# Altium footprint library Cty1.PcbLib: 1378 footprints (part 53 of 87)
Each footprint in its own frame and in the unit in brackets; x right, y up, seen from the top. Pads: shape width x height; smd on the part's side, far side on the other; paste and mask are expansions set on the pad; w line width, h text height; cw(c..) or ccw(c..) is an arc to the next point about the centre after c.
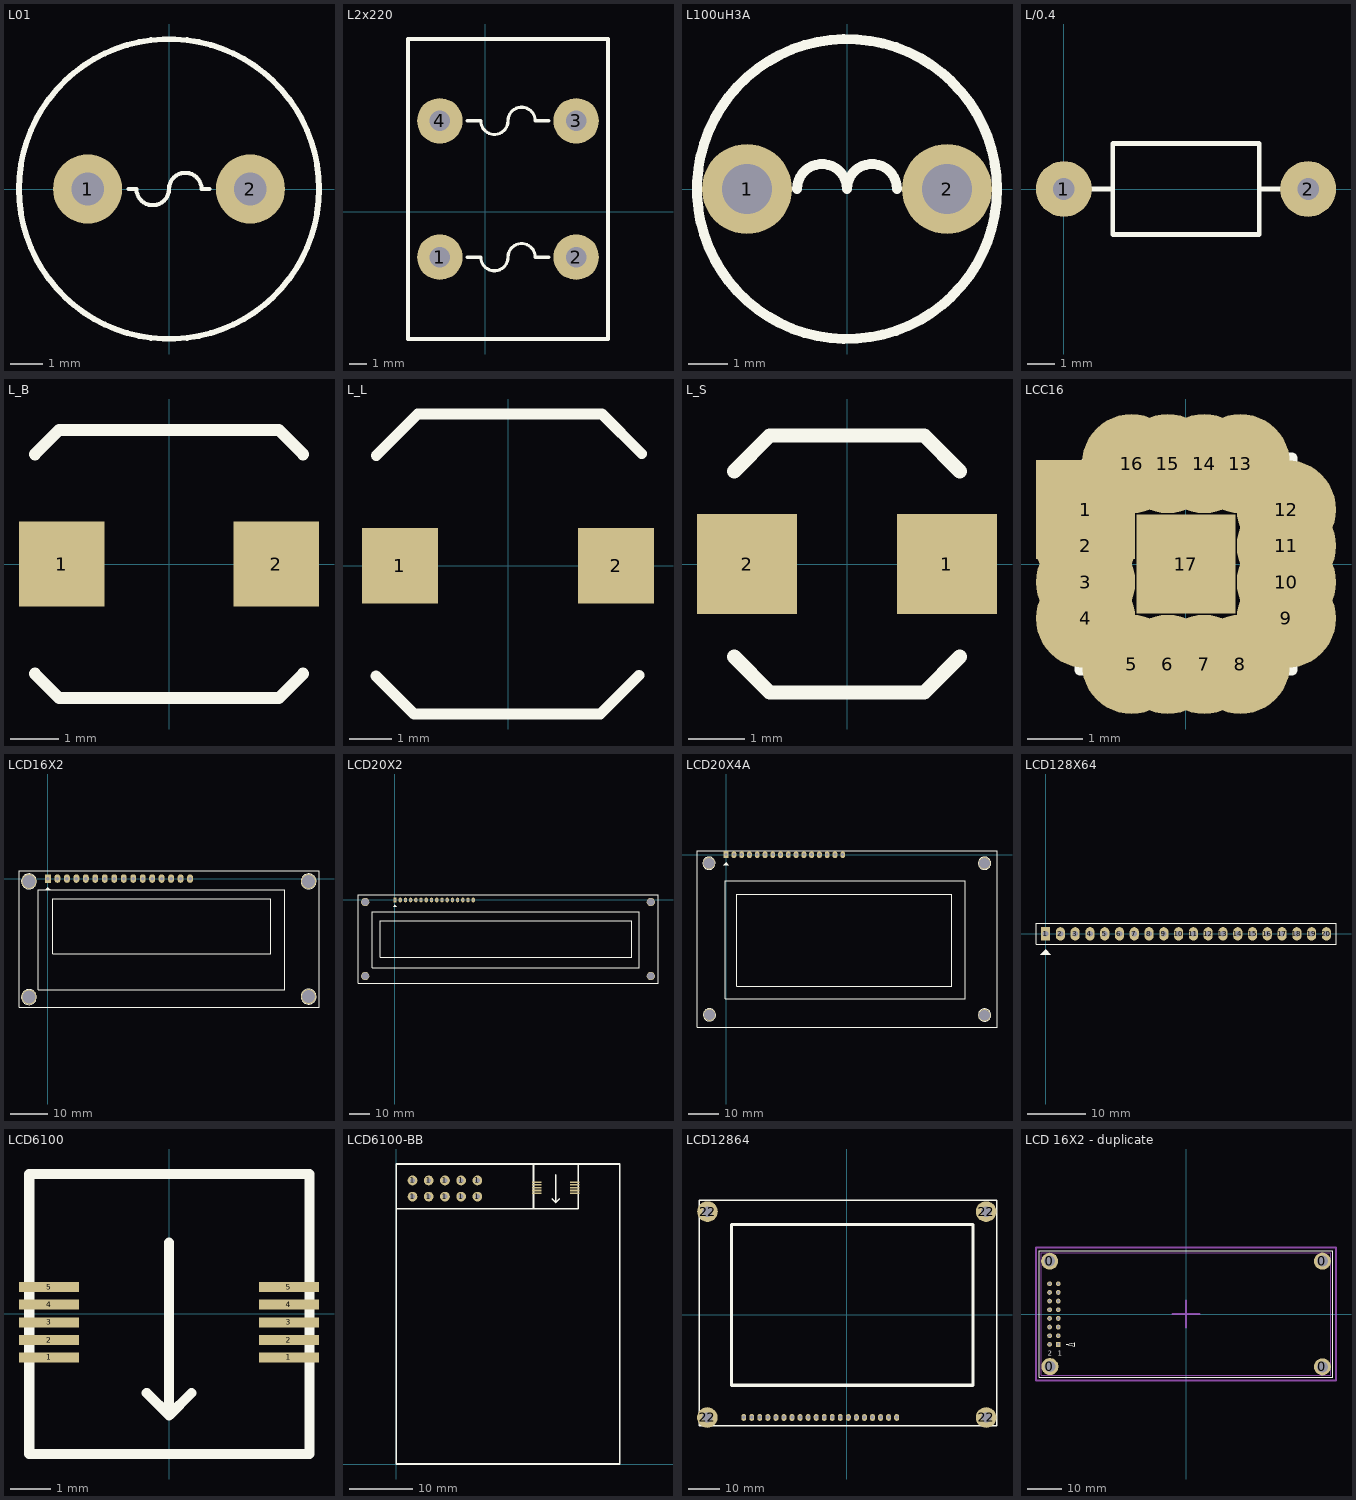
[diagram p52: the footprints below, top view; thin cyan lines are the x and y axes]

## L01 [mil] "Inductor"
pads (2):
  round 85 hole 40: 1(-100,0) 2(100,0)
Top Overlay:
  circle w7: c0,0 r184.39
  lines w5: -50,0 -40,0 ccw(c-20,0) 0,0 cw(c20,0) 40,0 50,0

## L2x220 [mil] "Loc 220"
pads (4):
  round 100 hole 45: 1(-100,-100) 2(200,-100) 3(200,200) 4(-100,200)
Top Overlay:
  lines w7: -10,-100 ccw(c20,-100) 50,-100 cw(c80,-100) 110,-100 ; -10,200 ccw(c20,200) 50,200 cw(c80,200) 110,200
  lines w8: -40,-100 -10,-100 ; -40,200 -10,200 ; 110,-100 140,-100 ; 110,200 140,200 ; -170,-280 270,-280 270,380 -170,380 -170,-280

## L100uH3A [mil] "100uH3A"
pads (2):
  round 90 hole 50: 1(-100,0) 2(100,0)
Top Overlay:
  circle w10: c0,0 r150
  lines w10: -50,0 cw(c-25,0) 0,0 cw(c25,0) 50,0

## L/0.4 [mil] "Inductor , 2 Pin, L 350mil, W 150 mil"
height 150
pads (2):
  round 80 hole 31: 1(0,0) 2(350,0)
Top Overlay:
  lines w7: 70,0 40,0 70,0 ; 70,0 70,-65 280,-65 280,0 ; 70,0 70,65 280,65 280,0 ; 280,0 310,0 280,0

## L_B [mil]
pads (2):
  rect 70x70 smd: 1(-88,0) 2(88,0)
Top Overlay:
  lines w10: -110,-90 -90,-110 90,-110 110,-90 ; -110,90 -90,110 90,110 110,90

## L_L [mil]
pads (2):
  rect 70x70 smd: 1(-100,0) 2(100,0)
Top Overlay:
  lines w10: -122.12,-102.12 -87,-137.25 85.5,-137.25 121.38,-101.38 ; -122,102 -83.5,140.5 87,140.5 123.75,103.75

## L_S [mil]
pads (2):
  rect 70x70 smd: 1(70,0) 2(-70,0)
Top Overlay:
  lines w10: -79,-65 -54,-90 54,-90 79,-65 ; -79,65 -54,90 54,90 79,65

## LCC16 [mil]
pads (17):
  rect 70x70 smd: 1(-70.87,38.39) 17(0,0)
  round 70 smd: 2(-70.87,12.8) 3(-70.87,-12.8) 4(-70.87,-38.39) 5(-38.39,-70.87) 6(-12.8,-70.87) 7(12.8,-70.87) 8(38.39,-70.87) 9(70.87,-38.39) 10(70.87,-12.8) 11(70.87,12.8) 12(70.87,38.39) 13(38.39,70.87) 14(12.8,70.87) 15(-12.8,70.87) 16(-38.39,70.87)
Top Overlay:
  lines w7.87: -74.8,-50.2 -74.8,-74.8 -50.2,-74.8 ; -74.8,50.2 -74.8,66.93 -66.93,74.8 -50.2,74.8 ; 50.2,-74.8 74.8,-74.8 74.8,-50.2 ; 50.2,74.8 74.8,74.8 74.8,50.2

## LCD16X2 [mil] "LCD dipslay 16x2, 16 pin"
height 400
pads (20):
  rect 62x90 hole 36: 1(0,0)
  oval 62x90 hole 36: 2(100,0) 3(200,0) 4(300,0) 5(400,0) 6(500,0) 7(600,0) 8(700,0) 9(800,0) 10(900,0) 11(1000,0) 12(1100,0) 13(1200,0) 14(1300,0) 15(1400,0) 16(1500,0)
  round 157.48 hole 137.8: "Hole 0"(-200,-1250) "Hole 0"(-200,-30) "Hole 0"(2750,-1245) "Hole 0"(2750,-30)
Top Overlay:
  circle w7: c-200,-1250 r79.06
  circle w7: c-200,-30 r79.06
  circle w7: c2750,-30 r79.06
  circle w7: c2750,-1245 r79.06
  region: 0,-90 -35,-125 35,-125
  lines w7: -305,-1355 2860,-1355 2860,80 -305,80 -305,-1355 ; -100,-1175 2500,-1175 2500,-120 -100,-120 -100,-1175 ; 50,-795 2350,-795 2350,-215 50,-215 50,-795
3D body "LCD module 16 X 2 backlight.STEP": height 414, standoff -106, extent -309.29,-1355 2860,82.01

## LCD20X2 [mil] "LCD dipslay 20x2, 16 pin"
height 400
pads (20):
  rect 62x90 hole 36: 1(0,0)
  oval 62x90 hole 36: 2(100,0) 3(200,0) 4(300,0) 5(400,0) 6(500,0) 7(600,0) 8(700,0) 9(800,0) 10(900,0) 11(1000,0) 12(1100,0) 13(1200,0) 14(1300,0) 15(1400,0) 16(1500,0)
  round 157.48 hole 137.8: "Hole 0"(-570.87,-1456.69) "Hole 0"(-570.87,-39.37) "Hole 0"(4901.57,-1456.69) "Hole 0"(4901.57,-39.37)
Top Overlay:
  region: 0,-90 -35,-125 35,-125
  lines w7: -708.66,-1594.49 5039.37,-1594.49 5039.37,100 -708.66,100 -708.66,-1594.49 ; -436,-1300 4682,-1300 4682,-225 -436,-225 -436,-1300 ; -286,-1100 4532,-1100 4532,-400 -286,-400 -286,-1100
3D body "SW3dPS-Display20x2.STEP": height 198, standoff -180, extent -100,-1437 4470,33

## LCD20X4A [mil] "LCD dipslay 20x4, 16 pin"
height 400
pads (20):
  rect 62x90 hole 39: 1(0,0)
  oval 62x90 hole 39: 2(100,0) 3(200,0) 4(300,0) 5(400,0) 6(500,0) 7(600,0) 8(700,0) 9(800,0) 10(900,0) 11(1000,0) 12(1100,0) 13(1200,0) 14(1300,0) 15(1400,0) 16(1500,0)
  round 157.48 hole 137.8: "Hole 0"(-220,-110) "Hole 0"(-215,-2060) "Hole 0"(3325,-2065) "Hole 0"(3325,-110)
Top Overlay:
  circle w7: c-215.06,-2061 r79.06
  circle w7: c-221.06,-110 r79.06
  circle w7: c3324.94,-110 r79.06
  circle w7: c3324.94,-2063 r79.06
  region: 0,-100 -35,-135 35,-135
  lines w7: -375,-2220 -375,50 3485,50 3485,-2220 -374,-2220 ; -11,-1852 3076,-1852 3076,-337 -11,-337 -11,-1852 ; 139,-1695 2905,-1695 2905,-512 139,-512 139,-1695
3D body "User Library-LCD20_4.STEP": height 417.32, standoff -125.98, extent -392.13,-2264.2 3466.13,98

## LCD128X64 [mil] "LCD Graphic 128x64, 20 pin"
height 400
pads (20):
  rect 62x90 hole 39: 1(0,0)
  oval 62x90 hole 39: 2(100,0) 3(200,0) 4(300,0) 5(400,0) 6(500,0) 7(600,0) 8(700,0) 9(800,0) 10(900,0) 11(1000,0) 12(1100,0) 13(1200,0) 14(1300,0) 15(1400,0) 16(1500,0) 17(1600,0) 18(1700,0) 19(1800,0) 20(1900,0)
Top Overlay:
  region: 0,-105 -35,-140 35,-140
  lines w7: -65,-71 -65,70 1965,70 1965,-71 -65,-71
3D body "User Library-GRAPHIC LCD WG12864B.STEP": height 475.59, standoff -130.71, extent -612.8,-2069.98 2536.8,56

## LCD6100 [mm]
pads (10):
  rect 1.5x0.25 smd: 1(-3,-1.091) 1(2.994,-1.091) 2(-3,-0.66) 2(2.994,-0.66) 3(-3,-0.215) 3(2.994,-0.215) 4(-3,0.229) 4(2.994,0.229) 5(-3,0.661) 5(2.994,0.661)
Top Overlay:
  lines w0.254: -0.559,-1.981 0,-2.54 ; 0,1.778 0,-2.54 ; 0.559,-1.981 0,-2.54 ; -3.493,-3.507 3.507,-3.507 3.507,3.493 -3.493,3.493 -3.493,-3.507

## LCD6100-BB [mil]
pads (20):
  round 60 hole 30: 1(100,1649) 1(100,1749) 1(200,1649) 1(200,1749) 1(300,1649) 1(300,1749) 1(400,1649) 1(400,1749) 1(500,1649) 1(500,1749)
  rect 59.06x9.84 smd: 1(865.83,1669.92) 1(1101.83,1669.92) 2(865.83,1686.92) 2(1101.83,1686.92) 3(865.83,1704.42) 3(1101.83,1704.42) 4(865.83,1721.92) 4(1101.83,1721.92) 5(865.83,1738.92) 5(1101.83,1738.92)
Top Overlay:
  lines w10: 0,0 1377.95,0 1377.95,1849.39 ; 0,1 0,1850.39 1377.95,1850.39 ; 0,1574.8 1122.05,1574.8 ; 961.96,1634.89 983.96,1612.89 ; 983.96,1782.89 983.96,1612.89 ; 1005.96,1634.89 983.96,1612.89 ; 1122.05,1574.8 846.46,1574.8 846.46,1850.39 1122.05,1850.39 1122.05,1574.8

## LCD12864 [mm] "LCD12864"
pads (25):
  oval 1.524x2.159 hole 1.1: 1(15.76,-32.5) 1(15.76,-32.5) 2(13.22,-32.5) 3(10.68,-32.5) 4(8.14,-32.5) 5(5.6,-32.5) 6(3.06,-32.5) 7(0.52,-32.5) 8(-2.02,-32.5) 9(-4.56,-32.5) 10(-7.1,-32.5) 11(-9.64,-32.5) 12(-12.18,-32.5) 13(-14.72,-32.5) 14(-17.26,-32.5) 15(-19.8,-32.5) 16(-22.34,-32.5) 17(-24.88,-32.5) 18(-27.42,-32.5) 19(-29.96,-32.5) 20(-32.5,-32.5)
  round 6.5 hole 3.3: 22(-44,-32.5) 22(-43.93,32.5) 22(44,-32.5) 22(44,32.5)
Top Overlay:
  lines w0.45: -46.54,-35.04 47.44,-35.04 47.44,36.08 -46.54,36.08 -46.54,-35.04
  lines w1: -36.38,-22.34 -36.38,28.46 39.82,28.46 39.82,-22.34 -36.38,-22.34

## LCD 16X2 - duplicate [mm]
pads (20):
  round 5 hole 3.2 mask+0.01: 0(-39.995,15.487) 0(-39.92,-15.438) 0(40.005,-15.488) 0(40.015,15.488)
  rect 1.4x1.4 hole 0.8 square mask+0.01: 1(-37.475,-8.908)
  round 1.4 hole 0.8 mask+0.01: 2(-40.015,-8.908) 3(-37.475,-6.368) 4(-40.015,-6.368) 5(-37.475,-3.828) 6(-40.015,-3.828) 7(-37.475,-1.288) 8(-40.015,-1.288) 9(-37.475,1.252) 10(-40.015,1.252) 11(-37.475,3.792) 12(-40.015,3.792) 13(-37.475,6.332) 14(-40.015,6.332) 15(-37.475,8.872) 16(-40.015,8.872)
Top Overlay:
  lines w0.2: -43,-18.5 43,-18.5 43,18.5 -43,18.5 -43,-18.5 ; -35.2,-8.9 -32.7,-8.4 -32.7,-9.4 -35.2,-8.9
  text "2" at -40.6,-12.3 h1.5
  text "1" at -37.6,-12.3 h1.5
Mechanical 13:
  lines w0.2: -42.47,-18.018 -42.49,-18.018 ; -42.49,-18.018 42.51,-18.018 42.51,17.982 -42.49,17.982 -42.49,-18.018
Mechanical 15:
  lines w0.5: -4,0 4,0 ; 0,-4 0,4 ; -44,-19.5 -44,19.5 44,19.5 44,-19.5 -44,-19.5
3D body "LCD Modul.STEP": height 21.52, standoff -2.98, extent -42.49,-18.018 42.51,17.982